# Altium footprint library JL_PCB.PCBLIB: 1112 footprints (part 8 of 71)
Each footprint in its own frame and in the unit in brackets; x right, y up, seen from the top. Pads: shape width x height; smd on the part's side, far side on the other; paste and mask are expansions set on the pad; w line width, h text height; cw(c..) or ccw(c..) is an arc to the next point about the centre after c.
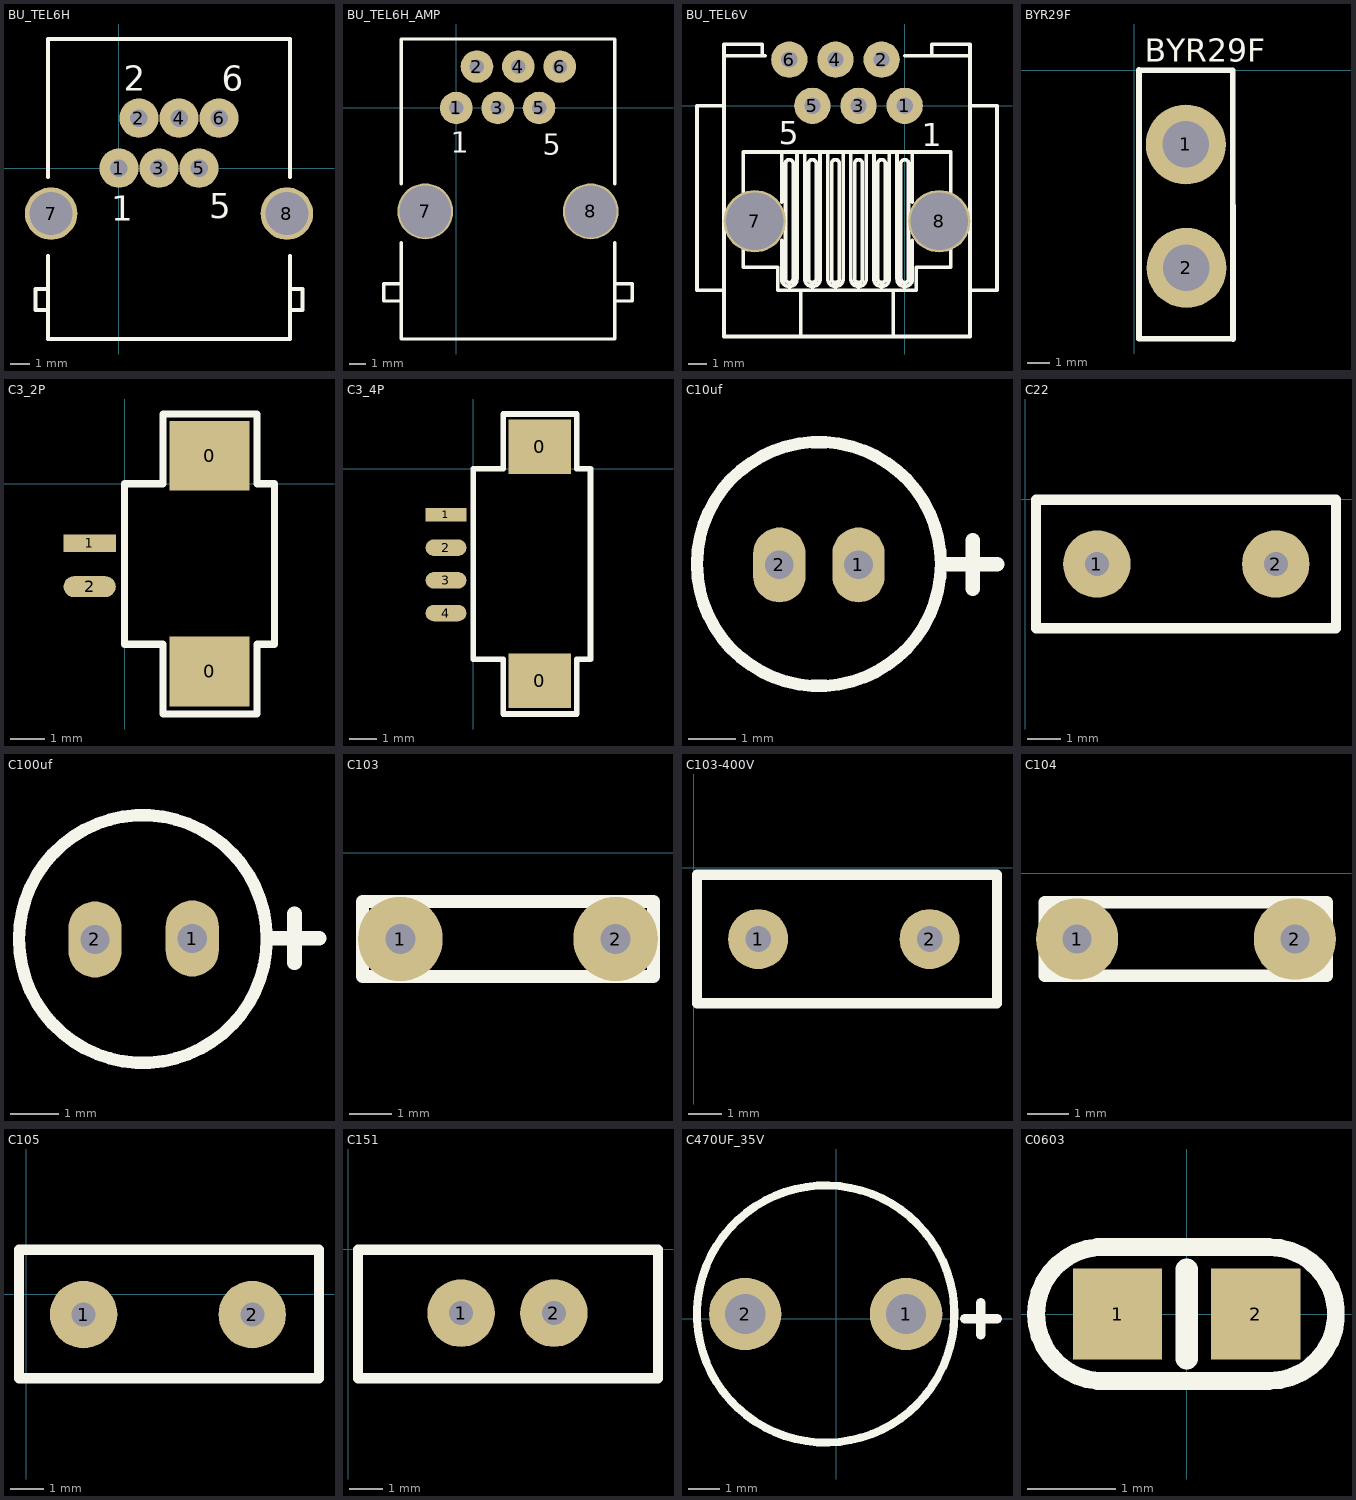
[diagram p7: the footprints below, top view; thin cyan lines are the x and y axes]

## BU_TEL6H [mil]
pads (8):
  round 78.74 hole 35: 1(0,0) 2(40,100) 3(80,0) 4(120,100) 5(160,0) 6(200,100)
  round 105 hole 86: 7(-135.83,-90.83) 8(335.83,-90.83)
TopOverlay:
  lines w8: -141.67,-283.33 -166.67,-283.33 -166.67,-241.67 -141.67,-241.67 ; -141.67,-175.59 -141.67,-341.67 341.67,-341.67 341.67,-175.59 ; -141.67,-18.11 -141.67,258.33 341.67,258.33 341.67,-18.11 ; 341.67,-283.33 366.67,-283.33 366.67,-241.67 341.67,-241.67
  text "1" at -15,-105 h50
  text "5" at 180,-100 h50
  text "2" at 10,155 h50
  text "6" at 205,155 h50

## BU_TEL6H_AMP [mm]
pads (8):
  round 2 hole 0.889: 1(0,0) 2(1.27,2.54) 3(2.54,0) 4(3.81,2.54) 5(5.08,0) 6(6.35,2.54)
  round 3.429 hole 3.175: 7(-1.905,-6.35) 8(8.255,-6.35)
TopOverlay:
  lines w0.203: -3.387,-11.853 -4.445,-11.853 -4.445,-10.795 -3.387,-10.795 ; -3.387,-8.26 -3.387,-14.182 9.737,-14.182 9.737,-8.26 ; -3.387,-4.66 -3.387,4.233 9.737,4.233 9.737,-4.66 ; 9.737,-11.853 10.795,-11.853 10.795,-10.795 9.737,-10.795
  text "5" at 5.294,-2.862 h1.27
  text "1" at -0.347,-2.751 h1.27

## BU_TEL6V [mm]
pads (8):
  round 2 hole 0.889: 1(0,0) 2(-1.27,2.54) 3(-2.54,0) 4(-3.81,2.54) 5(-5.08,0) 6(-6.35,2.54)
  round 3.429 hole 3.175: 7(-8.255,-6.35) 8(1.905,-6.35)
TopOverlay:
  circle w0.203: c-8.255,-6.35 r1.482
  circle w0.203: c1.905,-6.35 r1.482
  lines w0.203: -9.948,-10.16 -11.43,-10.16 -11.43,0 -9.948,0 ; -8.89,-7.832 -8.89,-8.89 -6.985,-8.89 -6.985,-10.16 -5.715,-10.16 ; -8.89,-4.868 -8.89,-2.54 -6.985,-2.54 -6.773,-2.54 ; -7.832,2.752 -7.832,2.963 -7.832,3.387 -9.948,3.387 -9.948,2.752 ; -7.675,2.752 -9.948,2.752 ; -6.773,-7.408 -6.773,-9.525 ccw(c-6.35,-9.525) -5.927,-9.525 -5.927,-2.54 ; -6.773,-5.292 -6.773,-2.54 ; -5.715,-12.7 -5.715,-10.16 ; -5.503,-2.54 -5.503,-9.525 ccw(c-5.08,-9.525) -4.657,-9.525 -4.657,-2.54 ; -4.233,-2.54 -4.233,-9.525 ccw(c-3.81,-9.525) -3.387,-9.525 -3.387,-2.54 ; -2.963,-2.54 -2.963,-9.525 ccw(c-2.54,-9.525) -2.117,-9.525 -2.117,-2.54 ; -1.693,-2.54 -1.693,-9.525 ccw(c-1.27,-9.525) -0.847,-9.525 -0.847,-2.54 ; -0.635,-12.7 -0.635,-10.16 ; -0.423,-2.54 -0.423,-9.525 ccw(c0,-9.525) 0.423,-9.525 0.423,-7.408 ; 0,2.752 3.598,2.752 ; 0.423,-5.292 0.423,-2.54 ; 1.482,2.752 1.482,3.387 3.598,3.387 3.598,2.752 ; 2.54,-7.832 2.54,-8.89 0.635,-8.89 0.635,-10.16 -0.635,-10.16 ; 2.54,-4.868 2.54,-2.54 0.635,-2.54 -6.773,-2.54 ; 3.598,-10.16 5.08,-10.16 5.08,0 3.598,0 ; -9.948,2.752 -9.948,-12.7 3.598,-12.7 3.598,2.752 ; -5.715,-10.16 -0.635,-10.16 ; -6.562,-9.525 ccw(c-6.35,-9.525) -6.138,-9.525 -6.138,-3.175 ccw(c-6.35,-3.175) -6.562,-3.175 -6.562,-9.525 ; -5.292,-9.525 ccw(c-5.08,-9.525) -4.868,-9.525 -4.868,-3.175 ccw(c-5.08,-3.175) -5.292,-3.175 -5.292,-9.525 ; -4.022,-9.525 ccw(c-3.81,-9.525) -3.598,-9.525 -3.598,-3.175 ccw(c-3.81,-3.175) -4.022,-3.175 -4.022,-9.525 ; -2.752,-9.525 ccw(c-2.54,-9.525) -2.328,-9.525 -2.328,-3.175 ccw(c-2.54,-3.175) -2.752,-3.175 -2.752,-9.525 ; -1.482,-9.525 ccw(c-1.27,-9.525) -1.058,-9.525 -1.058,-3.175 ccw(c-1.27,-3.175) -1.482,-3.175 -1.482,-9.525 ; -0.212,-9.525 ccw(c0,-9.525) 0.212,-9.525 0.212,-3.175 ccw(c0,-3.175) -0.212,-3.175 -0.212,-9.525
  text "1" at 0.95,-2.218 h1.27
  text "5" at -6.921,-2.121 h1.27

## BYR29F [mil]
pads (2):
  round 137.79 hole 80: 1(88.82,-127.48) 2(90,-340)
TopOverlay:
  lines w10: 8.27,-462.12 8.27,0.47 169.8,0.4 170.1,-462.4 8.27,-462.12
  text "BYR29F" at 18.4,14.7 h39.37

## C3_2P [mm]
height 3.4
pads (4):
  rect 2.3x2 smd: 0(2.438,-5.379) 0(2.438,0.806)
  rect 1.5x0.5 smd: 1(-1,-1.7)
  oval 1.5x0.6 smd: 2(-1,-2.95)
TopOverlay:
  lines w0.203: 1.1,-0.007 1.1,2 3.8,2 3.8,0 4.3,0 4.3,-4.6 3.8,-4.6 ; 1.1,0 0,0 0,-4.6 1.1,-4.6 1.1,-6.6 3.8,-6.6 ; 3.8,-6.589 3.8,-4.589
3D body "01111.stp": height 3.46, standoff 0.01, extent -0.286,-6.111 4.064,1.489

## C3_4P [mm]
height 3.4
pads (6):
  rect 2.3x2 smd: 0(2.438,-7.779) 0(2.438,0.806)
  rect 1.5x0.5 smd: 1(-1,-1.7)
  oval 1.5x0.6 smd: 2(-1,-2.9) 3(-1,-4.1) 4(-1,-5.3)
TopOverlay:
  lines w0.203: 1.1,-7 0,-7 0,0 1.1,0 ; 1.1,-6.992 1.1,-9 3.8,-9 3.8,-7 4.3,-7 4.3,0 3.8,0 3.8,2 1.1,2 1.1,-0.007 ; 3.8,-7.002 3.802,-7
3D body "CS_4P.stp": height 3.45, standoff 0, extent -0.134,-8.454 4.216,1.546

## C10uf [mm]
pads (2):
  oval 1.1x1.575 hole 0.6: 1(7.76,-5.6) 2(6.1,-5.6)
TopOverlay:
  circle w0.254: c6.93,-5.58 r2.561
  lines w0.305: 9.652,-5.588 10.668,-5.588 ; 10.16,-6.096 10.16,-5.08

## C22 [mm]
pads (2):
  round 2 hole 0.711: 1(2.12,-1.925) 2(7.42,-1.925)
TopOverlay:
  lines w0.305: 0.315,-3.83 0.315,-0.02 9.205,-0.02 9.205,-3.83 0.315,-3.83

## C100uf [mm]
pads (2):
  oval 1.1x1.575 hole 0.6: 1(5,-6.61) 2(2.99,-6.63)
TopOverlay:
  circle w0.254: c3.98,-6.62 r2.561
  lines w0.305: 6.604,-6.604 7.62,-6.604 ; 7.112,-7.112 7.112,-6.096

## C103 [mil]
pads (2):
  round 78.74 hole 28: 1(80,-80) 2(280,-80)
TopOverlay:
  lines w12: 45,-115 315,-115 315,-45 45,-45 45,-115

## C103-400V [mil]
pads (2):
  round 70 hole 30: 1(75,-83) 2(275,-83)
TopOverlay:
  lines w12: 3.61,-157.99 353.61,-157.99 353.61,-7.99 3.61,-7.99 3.61,-157.99

## C104 [mm]
pads (2):
  round 2 hole 0.711: 1(2.1,-1.6) 2(7.4,-1.6)
TopOverlay:
  lines w0.305: 1.311,-2.489 8.169,-2.489 8.169,-0.711 1.311,-0.711 1.311,-2.489

## C105 [mm]
pads (2):
  round 2 hole 0.711: 1(1.7,-0.6) 2(6.7,-0.6)
TopOverlay:
  lines w0.305: -0.213,-2.489 8.677,-2.489 8.677,1.321 -0.213,1.321 -0.213,-2.489

## C151 [mm]
pads (2):
  round 2 hole 0.711: 1(3.35,-1.9) 2(6.1,-1.9)
TopOverlay:
  lines w0.305: 0.295,-3.83 9.185,-3.83 9.185,-0.02 0.295,-0.02 0.295,-3.83

## C470UF_35V [mil]
pads (2):
  round 90 hole 50: 1(87,6) 2(-113,6)
TopOverlay:
  circle w10: c-13,6 r159.86
  lines w12: 160,0 200,0 ; 180,-20 180,20

## C0603 [mil]
pads (2):
  rect 40x41 smd: 1(-31,0) 2(31,0)
TopOverlay:
  lines w8: -40.03,30 ccw(c-37.51,0) -39.97,-30 ; -40,-30 37,-30 ccw(c37,0) 37,30 -40,30
  lines w10: 0,-20 0,20
3D body "User Library-0603 SMD Capacitor.step": height 12.49, standoff 0.6, extent -30.49,-14.74 32.5,16.76